# Altium footprint library RoBeast_PCB_Library.PcbLib: 71 footprints (part 1 of 5)
Each footprint in its own frame and in the unit in brackets; x right, y up, seen from the top. Pads: shape width x height; smd on the part's side, far side on the other; paste and mask are expansions set on the pad; w line width, h text height; cw(c..) or ccw(c..) is an arc to the next point about the centre after c.
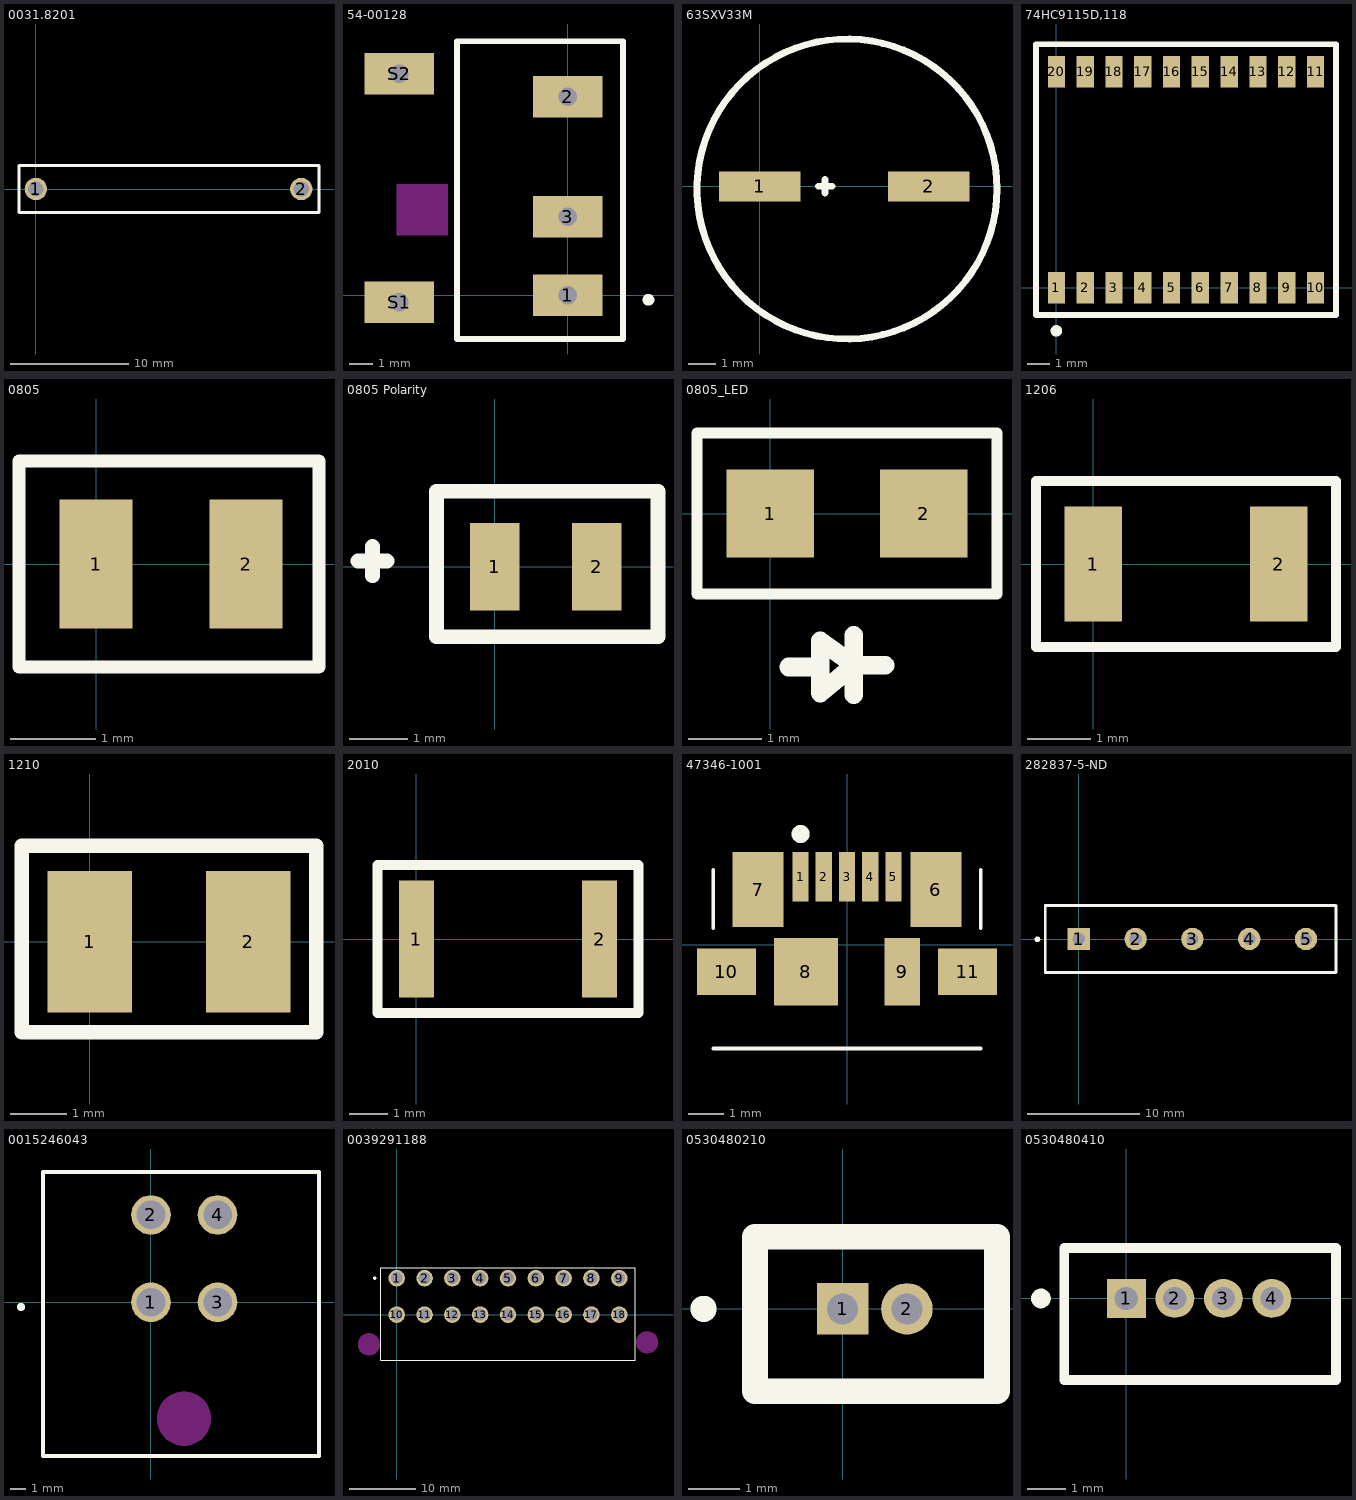
[diagram p0: the footprints below, top view; thin cyan lines are the x and y axes]

## 0031.8201 [mm]
pads (2):
  round 1.9 hole 1.3: 1(0,0) 2(22.5,0)
Top Overlay:
  lines w0.254: -1.431,-2 -1.431,2 24,2 24,-2 -1.431,-2
3D body "0217005.MXP.STEP": height 9.65, standoff 4.35, extent 1.6,-2.5 21.6,2.8
3D body "3527.step": height 11.18, standoff -6.98, extent -1.024,-2.841 23.484,3.509

## 54-00128 [mm]
pads (5):
  rect 3x1.8 hole 0.8 square: 1(0,0) 2(0,8.6) 3(0,3.4) S1(-7.3,-0.3) S2(-7.3,9.6)
Top Overlay:
  circle w0.254: c3.5,-0.2 r0.127
  lines w0.254: 2.4,10.9 2.4,-1.9 -4.8,-1.9 -4.8,11 2.4,11
Keep-Out Layer:
  board cut-out: -7.4,2.6 -7.4,4.8 -5.2,4.8 -5.2,2.6
3D body "54-00128.STEP": height 6.61, standoff -3.19, extent -10.3,-0.2 1.4,9.9

## 63SXV33M [mm]
pads (2):
  rect 3x1.1 smd: 1(0,0) 2(6.2,0)
Top Overlay:
  circle w0.254: c3.2,-0.1 r5.5
  lines w0.254: 2.15,0 2.65,0 ; 2.4,-0.25 2.4,0.25
3D body "8 SIZE CODE E12.stp": height 11.85, standoff -0.05, extent -1.6,-4.15 7.4,4.15

## 74HC9115D,118 [mm]
pads (20):
  rect 0.76x1.4 smd: 1(0,0) 2(1.27,0) 3(2.54,0) 4(3.81,0) 5(5.08,0) 6(6.35,0) 7(7.62,0) 8(8.89,0) 9(10.16,0) 10(11.43,0) 11(11.43,9.53) 12(10.16,9.53) 13(8.89,9.53) 14(7.62,9.53) 15(6.35,9.53) 16(5.08,9.53) 17(3.81,9.53) 18(2.54,9.53) 19(1.27,9.53) 20(0,9.53)
Top Overlay:
  circle w0.254: c0,-1.9 r0.127
  lines w0.254: -0.9,-1.2 12.333,-1.2 12.333,10.74 -0.9,10.74 -0.9,-1.2
3D body "74AC245SC.STEP": height 2.65, standoff 0, extent -0.7,-0.35 12.1,9.95

## 0805 [mm]
pads (2):
  rect 0.85x1.5 smd: 1(0,0) 2(1.75,0)
Top Overlay:
  lines w0.15: -0.9,-1.2 -0.9,1.2 2.6,1.2 2.6,-1.2 -0.9,-1.2
3D body "0805.step": height 0.64, standoff 0, extent -0.23,-0.698 2.03,0.698

## 0805 Polarity [mm]
pads (2):
  rect 0.85x1.5 smd: 1(0,0) 2(1.75,0)
Top Overlay:
  lines w0.254: -2.35,0.1 -1.85,0.1 ; -2.1,-0.15 -2.1,0.35 ; -1,-1.2 2.8,-1.2 2.8,1.3 -1,1.3 -1,-1.2
3D body "0805.step": height 0.64, standoff 0, extent -0.23,-0.698 2.03,0.698

## 0805_LED [mm]
pads (2):
  rect 1.2x1.2 smd: 1(0,0) 2(2.1,0)
Top Overlay:
  lines w0.15: -1,-1.1 -1,1.1 3.1,1.1 3.1,-1.1 -1,-1.1
  lines w0.254: 0.254,-2.095 0.686,-2.095 ; 1.143,-2.476 1.143,-2.07 ; 1.575,-2.07 1.143,-2.07 ; 0.686,-2.095 0.686,-1.74 1.143,-2.07 ; 0.686,-2.095 0.686,-2.451 1.143,-2.07 ; 1.143,-2.07 1.143,-1.664 1.143,-2.07
3D body "APT2012.STEP": height 0.77, standoff 0.02, extent 0,-0.625 2,0.625

## 1206 [mm]
pads (2):
  rect 0.9x1.8 smd: 1(0,0) 2(2.9,0)
Top Overlay:
  lines w0.15: -0.9,-1.3 -0.9,1.3 3.8,1.3 3.8,-1.3 -0.9,-1.3
3D body "1206.step": height 0.71, standoff 0, extent -0.2,-0.8 3,0.8

## 1210 [mm]
pads (2):
  rect 1.5x2.5 smd: 1(0,0) 2(2.8,0)
Top Overlay:
  lines w0.254: -1.2,-1.6 4,-1.6 4,1.7 -1.2,1.7 -1.2,-1.6
3D body "RC1210JR-070RL.step": height 0.65, standoff 0, extent -0.15,-1.3 2.95,1.3

## 2010 [mm]
pads (2):
  rect 0.9x3 smd: 1(0,0) 2(4.7,0)
Top Overlay:
  lines w0.254: -1,-1.9 -1,1.9 5.7,1.9 5.7,-1.9 -1,-1.9
3D body "CR2010-JW-101ELF.STEP": height 0.7, standoff 0, extent -0.2,-1.2 4.8,1.3

## 47346-1001 [mm]
pads (11):
  rect 0.45x1.38 smd mask+0.051: 1(-1.3,1.903) 2(-0.65,1.903) 3(0,1.903) 4(0.65,1.903) 5(1.3,1.903)
  rect 1.425x2.1 smd mask+0.051: 6(2.487,1.544) 7(-2.487,1.544)
  rect 1.8x1.9 smd mask+0.051: 8(-1.15,-0.756)
  rect 1x1.9 smd mask+0.051: 9(1.55,-0.756)
  rect 1.65x1.3 smd mask+0.051: 10(-3.375,-0.756) 11(3.375,-0.756)
Top Overlay:
  circle w0.254: c-1.3,3.1 r0.127
  lines w0.1: -3.75,-2.906 3.75,-2.906 ; -3.75,0.467 -3.75,2.094 ; 3.75,0.467 3.75,2.094
3D body "473461001.stp": height 2.72, standoff 0.01, extent -3.9,-2.85 3.9,2.15

## 282837-5-ND [mm]
pads (5):
  rect 2x2 hole 1.1: 1(0,0)
  round 2 hole 1.1: 2(5.08,0) 3(10.16,0) 4(15.24,0) 5(20.32,0)
Top Overlay:
  circle w0.254: c-3.702,-0.033 r0.127
  lines w0.254: -3,-3 -3,3 23,3 23,-3 -3,-3
3D body "c-282837-5-f-3d.stp": height 10.25, standoff -3.25, extent -3,-4.1 23,4.1

## 0015246043 [mm]
pads (4):
  round 2.5 hole 1.8: 1(0,0) 2(0,5.5) 3(4.2,0) 4(4.2,5.5)
Top Overlay:
  circle w0.254: c-8.2,-0.3 r0.127
  lines w0.254: -6.8,-9.7 10.6,-9.7 10.6,8.2 -6.8,8.2 -6.8,-9.7
Keep-Out Layer:
  board cut-out: 2.085,-9.051 1.918,-9.051 1.589,-8.985 1.28,-8.857 1.001,-8.671 0.765,-8.434 0.579,-8.156 0.451,-7.846 0.385,-7.518 0.385,-7.351 0.385,-7.183 0.451,-6.855 0.579,-6.545 0.765,-6.267 1.001,-6.03 1.28,-5.844 1.589,-5.716 1.918,-5.651 2.085,-5.651 2.253,-5.651 2.581,-5.716 2.89,-5.844 3.169,-6.03 3.406,-6.267 3.592,-6.545 3.72,-6.855 3.785,-7.183 3.785,-7.351 3.785,-7.518 3.72,-7.846 3.592,-8.156 3.406,-8.434 3.169,-8.671 2.89,-8.857 2.581,-8.985 2.253,-9.051
3D body "015246043.stp": height 14.5, standoff -3.8, extent -5.6,-15.55 9.4,5.675

## 0039291188 [mm]
pads (18):
  round 2.5 hole 1.8: 1(0,5.5) 2(4.2,5.5) 3(8.4,5.5) 4(12.6,5.5) 5(16.8,5.5) 6(21,5.5) 7(25.2,5.5) 8(29.4,5.5) 9(33.6,5.5) 10(0,0) 11(4.2,0) 12(8.4,0) 13(12.6,0) 14(16.8,0) 15(21,0) 16(25.2,0) 17(29.4,0) 18(33.6,0)
Top Overlay:
  circle w0.254: c-3.327,5.5 r0.127
  lines w0.15: -2.4,-6.915 -2.4,7.1 36,7.1 36,-6.915 -2.4,-6.915
Keep-Out Layer:
  board cut-out: -5.85,-4.5 -5.85,-4.663 -5.787,-4.981 -5.662,-5.282 -5.482,-5.552 -5.252,-5.782 -4.982,-5.962 -4.681,-6.087 -4.363,-6.15 -4.2,-6.15 -4.037,-6.15 -3.719,-6.087 -3.418,-5.962 -3.148,-5.782 -2.918,-5.552 -2.738,-5.282 -2.613,-4.981 -2.55,-4.663 -2.55,-4.5 -2.55,-4.337 -2.613,-4.019 -2.738,-3.718 -2.918,-3.448 -3.148,-3.218 -3.418,-3.038 -3.719,-2.913 -4.037,-2.85 -4.2,-2.85 -4.363,-2.85 -4.681,-2.913 -4.982,-3.038 -5.252,-3.218 -5.482,-3.448 -5.662,-3.718 -5.787,-4.019 -5.85,-4.337
  board cut-out: 36.15,-4.2 36.15,-4.363 36.213,-4.681 36.338,-4.982 36.518,-5.252 36.748,-5.482 37.018,-5.662 37.319,-5.787 37.637,-5.85 37.8,-5.85 37.963,-5.85 38.281,-5.787 38.582,-5.662 38.852,-5.482 39.082,-5.252 39.262,-4.982 39.387,-4.681 39.45,-4.363 39.45,-4.2 39.45,-4.037 39.387,-3.719 39.262,-3.418 39.082,-3.148 38.852,-2.918 38.582,-2.738 38.281,-2.613 37.963,-2.55 37.8,-2.55 37.637,-2.55 37.319,-2.613 37.018,-2.738 36.748,-2.918 36.518,-3.148 36.338,-3.418 36.213,-3.719 36.15,-4.037
3D body "039291188.stp": height 11.9, standoff -3, extent -7.6,-13.8 41.4,6.135

## 0530480210 [mm]
pads (2):
  rect 1x1 hole 0.6 mask+0.051: 1(0,0)
  round 1 hole 0.6 mask+0.051: 2(1.25,0)
Top Overlay:
  circle w0.254: c-2.7,0 r0.127
  lines w0.5: -1.7,-1.6 -1.7,1.4 3,1.4 3,-1.6 -1.7,-1.6
3D body "530480210.step": height 3.1, standoff -2.7, extent -1.499,-4.495 2.751,1.005

## 0530480410 [mm]
pads (4):
  rect 1x1 hole 0.6 mask+0.051: 1(0,0)
  round 1 hole 0.6 mask+0.051: 2(1.25,0) 3(2.5,0) 4(3.75,0)
Top Overlay:
  circle w0.254: c-2.2,0 r0.127
  lines w0.254: -1.6,-2.1 -1.6,1.3 5.4,1.3 5.4,-2.1 -1.6,-2.1
3D body "530480410.step": height 3.1, standoff -2.7, extent -1.486,-4.48 5.264,1.02